# Altium footprint library CryptLib.PcbLib: 44 footprints (part 3 of 3)
Each footprint in its own frame and in the unit in brackets; x right, y up, seen from the top. Pads: shape width x height; smd on the part's side, far side on the other; paste and mask are expansions set on the pad; w line width, h text height; cw(c..) or ccw(c..) is an arc to the next point about the centre after c.
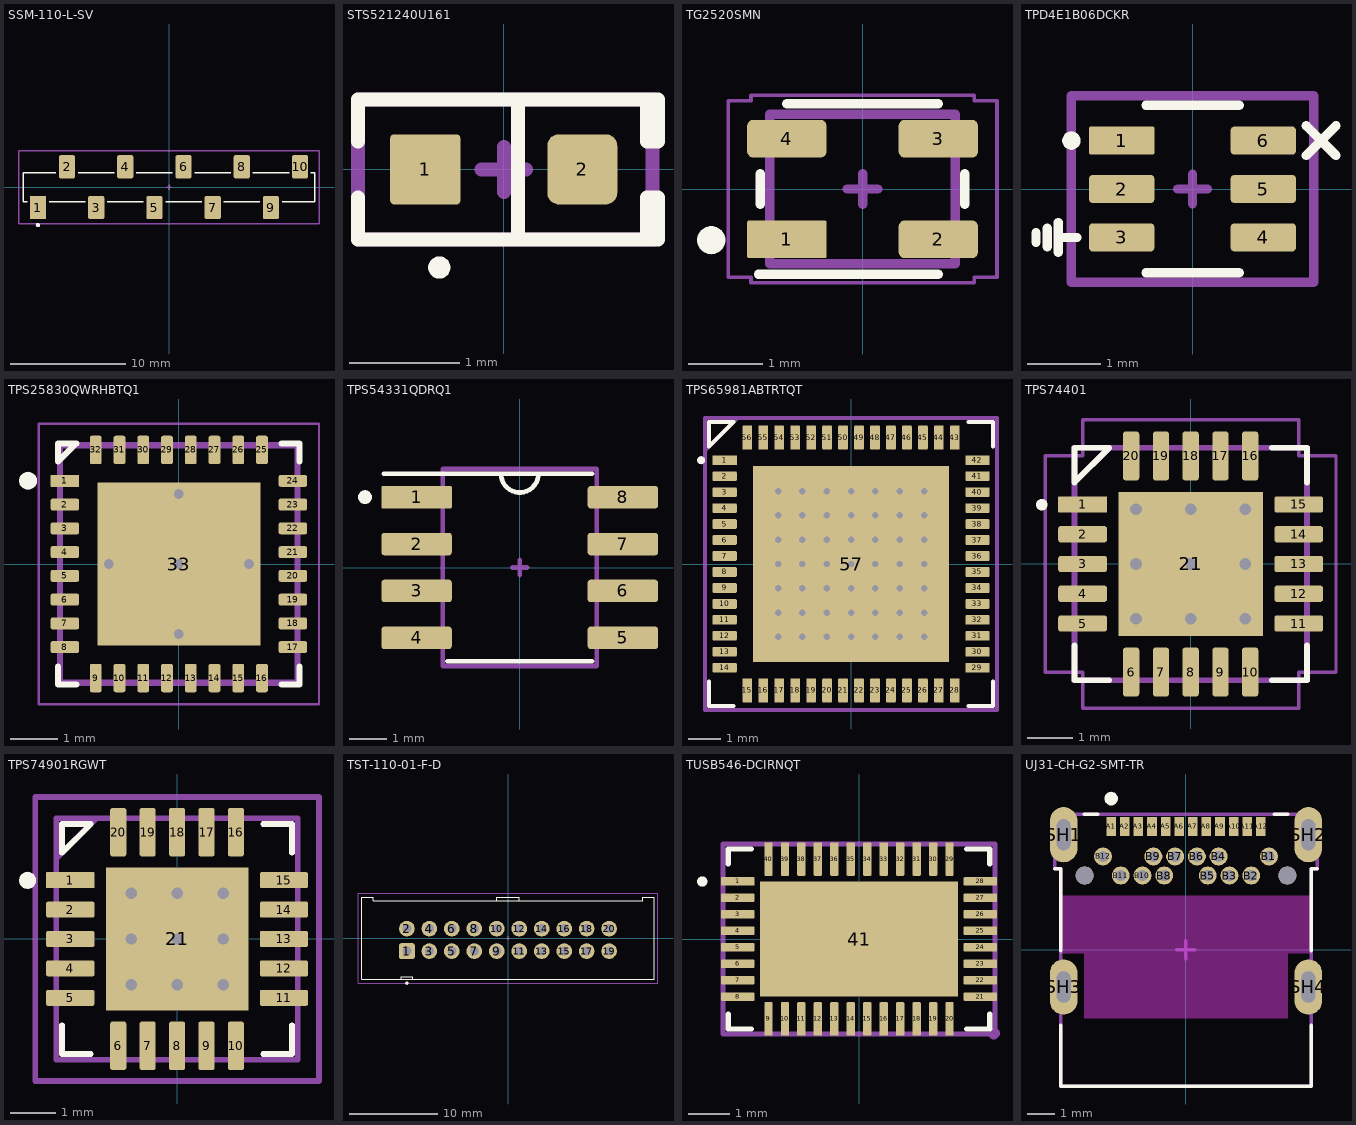
[diagram p2: the footprints below, top view; thin cyan lines are the x and y axes]

## SSM-110-L-SV [mil]
pads (12):
  rrect10% 56x80 smd: 1(-450,-70)
  rrect25% 56x80 smd: 2(-350,70) 3(-250,-70) 4(-150,70) 5(-50,-70) 6(50,70) 7(150,-70) 8(250,70) 9(350,-70) 10(450,70)
  round 15 on Top Overlay: ""(-450,-130)
  round 7.5 on Mech8: ""(-450,-70)
Top Overlay:
  lines w5: -487,-50 -500,-50 -500,50 -388,50 ; -412,-50 -288,-50 ; -312,50 -188,50 ; -212,-50 -88,-50 ; -112,50 12,50 ; -12,-50 112,-50 ; 88,50 212,50 ; 188,-50 312,-50 ; 288,50 412,50 ; 388,-50 500,-50 500,50 487,50
Top Designator:
  text "'.Designator'" at -113.3,-8.33 h20
Top Assembly:
  lines w5: -8,0 8,0 ; 0,-8 0,8 ; -515,-125 -515,125 515,125 515,-125 -515,-125
3D body "SSM-110-L-SV.stp": height 295.5, standoff 0.5, extent -500.01,-90 499.99,90

## STS521240U161 [mil]
pads (4):
  rrect10% 25x25 smd: 1(-28,0)
  rrect33% 25x25 smd: 2(28,0)
  round 7.5 on Mech8: ""(-28,0)
  round 8 on Top Overlay: ""(-23,-35)
Top Overlay:
  lines w5: -52,-10 -52,-25 55,-25 55,-10 51,-10 51,-25 ; -52,10 -52,25 55,25 55,10 51,10 51,25 ; 5,-25 5,25
Top Designator:
  text "'.Designator'" at -113.3,-8.33 h20
Top Assembly:
  lines w5: -8,0 8,0 ; 0,-8 0,8 ; -52,-25 -52,25 53,25 53,-25 -52,-25
3D body "User Library-SOD523-2.step": height 26.13, standoff 0.5, extent -32.48,-15.75 32.48,15.73

## TG2520SMN [mil] "4-SMD 2.5x2.0"
height 32
pads (6):
  rrect10% 42x20 smd: 1(-40,-26.57)
  rrect33% 42x20 smd: 2(40,-26.57) 3(40,26.57) 4(-40,26.57)
  round 15 on Top Overlay: ""(-80,-27)
  round 7.5 on Mech8: ""(-40,-26.57)
Top Overlay:
  lines w5: -55,-45 40,-45 ; -54,-8 -54,8 ; -40,45 40,45 ; 54,-8 54,8
Top Designator:
  text "'.Designator'" at -113.3,-8.33 h20
Top Assembly:
  lines w5: -8,0 8,0 ; 0,-8 0,8 ; -49,-39.5 -49,39.5 49,39.5 49,-39.5 -49,-39.5
Top Courtyard (Mech10):
  lines w2: -71,-46.57 -59,-46.57 -59,-49.5 59,-49.5 59,-46.57 71,-46.57 71,46.57 59,46.57 59,49.5 -59,49.5 -59,46.57 -71,46.57 -71,-46.57
3D body "TG2520SMN.stp": height 32.39, standoff 0.5, extent -51.32,-42.39 51.05,40.29

## TPD4E1B06DCKR [mil]
pads (8):
  rrect10% 35x15 smd: 1(-38,26)
  rrect25% 35x15 smd: 2(-38,0) 3(-38,-26) 4(38,-26) 5(38,0) 6(38,26)
  round 10 on Top Overlay: ""(-65,26)
  round 7.5 on Mech8: ""(-38,26)
Top Overlay:
  lines w5: -84,-28.5 -84,-23.5 ; -78,-31 -78,-21 ; -72,-34 -72,-18 ; -72,-26 -62,-26 ; -25,-45 25,-45 ; -25,45 25,45 ; 61,18 77,34 ; 61,34 77,18
Top Designator:
  text "'.Designator'" at -113.3,-8.33 h20
Top Assembly:
  lines w5: -8,0 8,0 ; 0,-8 0,8
Mechanical 15:
  lines w5: -65,-50 -65,50 65,50 65,-50 -65,-50
3D body "TPD4E1B06DCKR.STEP": height 43.81, standoff 0.5, extent -41.34,-39.38 41.34,39.36

## TPS25830QWRHBTQ1 [mm]
pads (40):
  rrect10% 0.6x0.25 smd mask+0: 1(-2.4,1.75)
  rrect33% 0.6x0.25 smd mask+0: 2(-2.4,1.25) 3(-2.4,0.75) 4(-2.4,0.25) 5(-2.4,-0.25) 6(-2.4,-0.75) 7(-2.4,-1.25) 8(-2.4,-1.75) 17(2.4,-1.75) 18(2.4,-1.25) 19(2.4,-0.75) 20(2.4,-0.25) 21(2.4,0.25) 22(2.4,0.75) 23(2.4,1.25) 24(2.4,1.75)
  rrect33% 0.25x0.6 smd mask+0: 9(-1.75,-2.4) 10(-1.25,-2.4) 11(-0.75,-2.4) 12(-0.25,-2.4) 13(0.25,-2.4) 14(0.75,-2.4) 15(1.25,-2.4) 16(1.75,-2.4) 25(1.75,2.4) 26(1.25,2.4) 27(0.75,2.4) 28(0.25,2.4) 29(-0.25,2.4) 30(-0.75,2.4) 31(-1.25,2.4) 32(-1.75,2.4)
  rect 3.429x3.429 smd paste-253.975 mask+0: 33(0,0)
  round 0.381 on Top Overlay: ""(-3.175,1.753)
  round 0.191 on Mech8: ""(-2.4,1.75)
  round 0.406 hole 0.203 mask+0: ""(-1.475,0) ""(0,-1.475) ""(0,0) ""(0,1.475) ""(1.475,0)
Top Overlay:
  lines w0.127: -2.54,-2.159 -2.54,-2.54 -2.159,-2.54 ; 2.159,-2.54 2.54,-2.54 2.54,-2.159 ; 2.159,2.54 2.54,2.54 2.54,2.159 ; -2.54,2.159 -2.54,2.54 -2.159,2.54 -2.54,2.159
Top Paste:
  region: -0.1,0.1 -1.59,0.1 -1.59,1.59 -0.1,1.59
  region: 1.59,0.1 0.1,0.1 0.1,1.59 1.59,1.59
  region: -0.1,-1.59 -1.59,-1.59 -1.59,-0.1 -0.1,-0.1
  region: 1.59,-1.59 0.1,-1.59 0.1,-0.1 1.59,-0.1
Top Solder:
  drawing of 33 lines, arcs and shapes, not listed
Top Designator:
  text "'.Designator'" at -2.878,-0.212 h0.51
Top Assembly:
  lines w0.127: -2.5,2.199 -2.199,2.5 ; -0.203,0 0.203,0 ; 0,-0.203 0,0.203 ; -2.5,-2.5 2.5,-2.5 2.5,2.5 -2.5,2.5 -2.5,-2.5
Top Courtyard (Mech10):
  lines w0.051: -2.95,-2.95 2.95,-2.95 2.95,2.95 -2.95,2.95 -2.95,-2.95
3D body "TPS25830QWRHBTQ1.STEP": height 1.01, standoff 0.01, extent -2.5,-2.5 2.5,2.5

## TPS54331QDRQ1 [mil]
pads (10):
  rrect10% 75x24 smd: 1(-110,75)
  rrect25% 75x24 smd: 2(-110,25) 3(-110,-25) 4(-110,-75) 5(110,-75) 6(110,-25) 7(110,25) 8(110,75)
  round 15 on Top Overlay: ""(-165,75)
  round 7.5 on Mech8: ""(-110,75)
Top Overlay:
  lines w5: -145,100 77,100 ; -77,-100 77,-100 ; -20,100 ccw(c0,100) 20,100
Top Designator:
  text "'.Designator'" at -113.3,-8.33 h20
Top Assembly:
  lines w5: -8,0 8,0 ; 0,-8 0,8 ; -82,-105 82,-105 82,105 -82,105 -82,-105
3D body "TPS54331QDRQ1.STEP": height 69.4, standoff 0.5, extent -118.11,-96.46 118.11,96.45

## TPS65981ABTRTQT [mil]
pads (108):
  rrect10% 30x12 smd: 1(-155.94,127.95)
  rrect25% 30x12 smd: 2(-155.94,108.27) 3(-155.94,88.58) 4(-155.94,68.9) 5(-155.94,49.21) 6(-155.94,29.53) 7(-155.94,9.84) 8(-155.94,-9.84) 9(-155.94,-29.53) 10(-155.94,-49.21) 11(-155.94,-68.9) 12(-155.94,-88.58) 13(-155.94,-108.27) 14(-155.94,-127.95) 29(155.94,-127.95) 30(155.94,-108.27) 31(155.94,-88.58) 32(155.94,-68.9) 33(155.94,-49.21) 34(155.94,-29.53) 35(155.94,-9.84) 36(155.94,9.84) 37(155.94,29.53) 38(155.94,49.21) 39(155.94,68.9) 40(155.94,88.58) 41(155.94,108.27) 42(155.94,127.95)
  rrect25% 12x30 smd: 15(-127.98,-155.94) 16(-108.3,-155.94) 17(-88.61,-155.94) 18(-68.92,-155.94) 19(-49.23,-155.94) 20(-29.54,-155.94) 21(-9.85,-155.94) 22(9.85,-155.94) 23(29.54,-155.94) 24(49.23,-155.94) 25(68.92,-155.94) 26(88.61,-155.94) 27(108.3,-155.94) 28(127.98,-155.94) 43(127.98,155.94) 44(108.3,155.94) 45(88.61,155.94) 46(68.92,155.94) 47(49.23,155.94) 48(29.54,155.94) 49(9.85,155.94) 50(-9.85,155.94) 51(-29.54,155.94) 52(-49.23,155.94) 53(-68.92,155.94) 54(-88.61,155.94) 55(-108.3,155.94) 56(-127.98,155.94)
  rect 242x242 smd: 57(0,0)
  round 10 on Top Overlay: ""(-185,128)
  round 7.5 on Mech8: ""(-155.94,127.95)
  round 16 hole 8 mask+0: ""(-90,-90) ""(-90,-60) ""(-90,-30) ""(-90,0) ""(-90,30) ""(-90,60) ""(-90,90) ""(-60,-90) ""(-60,-60) ""(-60,-30) ""(-60,0) ""(-60,30) ""(-60,60) ""(-60,90) ""(-30,-90) ""(-30,-60) ""(-30,-30) ""(-30,0) ""(-30,30) ""(-30,60) ""(-30,90) ""(0,-90) ""(0,-60) ""(0,-30) ""(0,0) ""(0,30) ""(0,60) ""(0,90) ""(30,-90) ""(30,-60) ""(30,-30) ""(30,0) ""(30,30) ""(30,60) ""(30,90) ""(60,-90) ""(60,-60) ""(60,-30) ""(60,0) ""(60,30) ""(60,60) ""(60,90) ""(90,-90) ""(90,-60) ""(90,-30) ""(90,0) ""(90,30) ""(90,60) ""(90,90)
Top Overlay:
  lines w5: -175,-145 -175,-175 -145,-175 ; 145,-175 175,-175 175,-145 ; 145,175 175,175 175,145 ; -175,145 -175,175 -145,175 -175,145
Top Designator:
  text "'.Designator'" at -113.3,-8.33 h20
Top Assembly:
  lines w5: -180,140 -140,180 ; -8,0 8,0 ; 0,-8 0,8 ; -180,-180 -180,180 180,180 180,-180 -180,-180
3D body "RTQ0056H.stp": height 39.37, standoff 0, extent -157.48,-157.48 157.49,157.49

## TPS74401 [mil] "LDO Regulator"
height 40
pads (23):
  rrect10% 42x14 smd: 1(-92.91,51.18)
  rrect33% 42x14 smd: 2(-92.91,25.59) 3(-92.91,0) 4(-92.91,-25.59) 5(-92.91,-51.18) 11(92.91,-51.18) 12(92.91,-25.59) 13(92.91,0) 14(92.91,25.59) 15(92.91,51.18)
  rrect33% 14x42 smd: 6(-51.18,-92.91) 7(-25.59,-92.91) 8(0,-92.91) 9(25.59,-92.91) 10(51.18,-92.91) 16(51.18,92.91) 17(25.59,92.91) 18(0,92.91) 19(-25.59,92.91) 20(-51.18,92.91)
  rect 124.02x124.02 smd paste-118.11: 21(0,0)
  round 10 on Top Overlay: ""(-128,51)
  round 7.5 on Mech8: ""(-92.91,51.18)
via 47.05,-47.05 diameter 20 hole 10
via 47.05,47.05 diameter 20 hole 10
via -47.05,47.05 diameter 20 hole 10
via -47.05,-47.05 diameter 20 hole 10
via 0,-47 diameter 20 hole 10
via 0,47 diameter 20 hole 10
via 47,0 diameter 20 hole 10
via -47,0 diameter 20 hole 10
via 0,0 diameter 20 hole 10
Top Overlay:
  lines w5: -100,-70 -100,-100 -70,-100 ; 70,-100 100,-100 100,-70 ; 70,100 100,100 100,70 ; -100,70 -100,100 -70,100 -100,70
Top Paste:
  region: -7.68,-47.05 -47.05,-47.05 -47.05,-7.68 -7.68,-7.68
  region: -7.68,7.68 -47.05,7.68 -47.05,47.05 -7.68,47.05
  region: 47.05,7.68 7.68,7.68 7.68,47.05 47.05,47.05
  region: 47.05,-47.05 7.68,-47.05 7.68,-7.68 47.05,-7.68
Top Designator:
  text "'.Designator'" at -113.3,-8.33 h20
Top Assembly:
  lines w5: -100,70 -70,100 ; -8,0 8,0 ; 0,-8 0,8 ; -100,-100 100,-100 100,100 -100,100 -100,-100
Top Courtyard (Mech10):
  lines w3: 125,91.91 125,-92.91 92.91,-92.91 92.91,-124 -92.91,-124 -92.91,-92.91 -125,-92.91 -125,92.91 -92.91,92.91 -92.91,124 92.91,124 92.91,92.91 125,92.91
3D body "step_temp.STEP": height 39.37, standoff 0, extent -98.43,-98.43 98.43,98.43

## TPS74901RGWT [mil]
pads (23):
  rrect10% 42x14 smd: 1(-92.91,51.18)
  rrect25% 42x14 smd: 2(-92.91,25.59) 3(-92.91,0) 4(-92.91,-25.59) 5(-92.91,-51.18) 11(92.91,-51.18) 12(92.91,-25.59) 13(92.91,0) 14(92.91,25.59) 15(92.91,51.18)
  rrect25% 14x42 smd: 6(-51.18,-92.91) 7(-25.59,-92.91) 8(0,-92.91) 9(25.59,-92.91) 10(51.18,-92.91) 16(51.18,92.91) 17(25.59,92.91) 18(0,92.91) 19(-25.59,92.91) 20(-51.18,92.91)
  rect 124x124 smd paste-999: 21(0,0)
  round 15 on Top Overlay: ""(-130,51)
  round 7.5 on Mech8: ""(-92.91,51.18)
via -40,40 diameter 20 hole 10
via 40,-40 diameter 20 hole 10
via 0,-40 diameter 20 hole 10
via -40,-40 diameter 20 hole 10
via -40,0 diameter 20 hole 10
via 0,40 diameter 20 hole 10
via 40,40 diameter 20 hole 10
via 40,0 diameter 20 hole 10
via 0,0 diameter 20 hole 10
Top Overlay:
  lines w5: -100,-75 -100,-100 -75,-100 ; 75,-100 100,-100 100,-75 ; 75,100 100,100 100,75 ; -100,75 -100,100 -75,100 -100,75
Top Paste:
  region: 47.05,-47.05 7.68,-47.05 7.68,-7.68 47.05,-7.68
  region: 47.05,7.68 7.68,7.68 7.68,47.05 47.05,47.05
  region: -7.68,7.68 -47.05,7.68 -47.05,47.05 -7.68,47.05
  region: -7.68,-47.05 -47.05,-47.05 -47.05,-7.68 -7.68,-7.68
Top Designator:
  text "'.Designator'" at -113.3,-8.33 h20
Top Assembly:
  lines w5: -105,70 -70,105 ; -105,-105 -105,105 105,105 105,-105 -105,-105
Top Courtyard (Mech10):
  lines w5: -123.43,-123.43 -123.43,123.43 123.43,123.43 123.43,-123.43 -123.43,-123.43
3D body "TPS74901RGWT.STEP": height 39.87, standoff 0.5, extent -98.42,-98.42 98.43,98.43

## TST-110-01-F-D [mil]
pads (22):
  rrect25% 70x70 hole 40: 1(-450,-57.48)
  round 70 hole 40: 2(-450,42.52) 3(-350,-57.48) 4(-350,42.52) 5(-250,-57.48) 6(-250,42.52) 7(-150,-57.48) 8(-150,42.52) 9(-50,-57.48) 10(-50,42.52) 11(50,-57.48) 12(50,42.52) 13(150,-57.48) 14(150,42.52) 15(250,-57.48) 16(250,42.52) 17(350,-57.48) 18(350,42.52) 19(450,-57.48) 20(450,42.52)
  round 15 on Top Overlay: ""(-450,-200)
  round 7.5 on Mech8: ""(-450,-57.48)
Top Overlay:
  lines w5: -50,167.48 -50,182.52 50,182.52 50,167.48 ; -475,-182.52 -475,-172.52 ; -475,-182.52 -475,-172.52 ; -475,-182.52 -650,-182.52 -650,182.52 -600,182.52 -600,167.48 -400,167.48 -300,167.48 -200,167.48 -100,167.48 0,167.48 100,167.48 200,167.48 300,167.48 400,167.48 600,167.48 600,182.52 650,182.52 650,-182.52 400,-182.52 300,-182.52 200,-182.52 100,-182.52 0,-182.52 -100,-182.52 -200,-182.52 -300,-182.52 -400,-182.52 -425,-182.52 ; -475,-182.52 -425,-182.52 ; -475,-172.52 -425,-172.52 ; -475,-172.52 -425,-172.52 ; -425,-182.52 -425,-172.52 ; -425,-182.52 -425,-172.52
Top Solder:
  circle w0: c-450,-57.48 r33.9
  circle w0: c-450,42.52 r33.9
  circle w0: c-350,-57.48 r33.9
  circle w0: c-350,42.52 r33.9
  circle w0: c-250,-57.48 r33.9
  circle w0: c-250,42.52 r33.9
  circle w0: c-150,-57.48 r33.9
  circle w0: c-150,42.52 r33.9
  circle w0: c-50,-57.48 r33.9
  circle w0: c-50,42.52 r33.9
  circle w0: c50,-57.48 r33.9
  circle w0: c50,42.52 r33.9
  circle w0: c150,-57.48 r33.9
  circle w0: c150,42.52 r33.9
  circle w0: c250,-57.48 r33.9
  circle w0: c250,42.52 r33.9
  circle w0: c350,-57.48 r33.9
  circle w0: c350,42.52 r33.9
  circle w0: c450,-57.48 r33.9
  circle w0: c450,42.52 r33.9
Bottom Solder:
  circle w0: c-450,-57.48 r33.9
  circle w0: c-450,42.52 r33.9
  circle w0: c-350,-57.48 r33.9
  circle w0: c-350,42.52 r33.9
  circle w0: c-250,-57.48 r33.9
  circle w0: c-250,42.52 r33.9
  circle w0: c-150,-57.48 r33.9
  circle w0: c-150,42.52 r33.9
  circle w0: c-50,-57.48 r33.9
  circle w0: c-50,42.52 r33.9
  circle w0: c50,-57.48 r33.9
  circle w0: c50,42.52 r33.9
  circle w0: c150,-57.48 r33.9
  circle w0: c150,42.52 r33.9
  circle w0: c250,-57.48 r33.9
  circle w0: c250,42.52 r33.9
  circle w0: c350,-57.48 r33.9
  circle w0: c350,42.52 r33.9
  circle w0: c450,-57.48 r33.9
  circle w0: c450,42.52 r33.9
Top Designator:
  text "'.Designator'" at -113.3,-8.33 h20
Top Assembly:
  lines w5: -8,0 8,0 ; 0,-8 0,8 ; -667.72,-200.24 -667.72,200.24 667.72,200.24 667.72,-200.24 -667.72,-200.24
3D body "TST-110-01-F-D.stp": height 350.5, standoff -129.5, extent -650,-182.48 650,182.52

## TUSB546-DCIRNQT [mil]
pads (43):
  rrect10% 32x8 smd: 1(-116,55.12)
  rrect25% 32x8 smd: 2(-116,39.37) 3(-116,23.62) 4(-116,7.87) 5(-116,-7.87) 6(-116,-23.62) 7(-116,-39.37) 8(-116,-55.12) 21(116,-55.12) 22(116,-39.37) 23(116,-23.62) 24(116,-7.87) 25(116,7.87) 26(116,23.62) 27(116,39.37) 28(116,55.12)
  rrect25% 8x32 smd: 9(-86.61,-76.5) 10(-70.87,-76.5) 11(-55.12,-76.5) 12(-39.37,-76.5) 13(-23.62,-76.5) 14(-7.87,-76.5) 15(7.87,-76.5) 16(23.62,-76.5) 17(39.37,-76.5) 18(55.12,-76.5) 19(70.87,-76.5) 20(86.61,-76.5) 29(86.61,76.5) 30(70.87,76.5) 31(55.12,76.5) 32(39.37,76.5) 33(23.62,76.5) 34(7.87,76.5) 35(-7.87,76.5) 36(-23.62,76.5) 37(-39.37,76.5) 38(-55.12,76.5) 39(-70.87,76.5) 40(-86.61,76.5)
  rect 189x110 smd paste-999: 41(0,0)
  round 10 on Top Overlay: ""(-150,55)
  round 7.5 on Mech8: ""(-116,55.12)
Top Overlay:
  lines w5: -125,-72 -125,-86 -103,-86 ; -125,72 -125,86 -103,86 ; 103,-86 125,-86 125,-72 ; 103,86 125,86 125,72
Top Paste:
  region: -35.44,51.06 -90.56,51.06 -90.56,3.94 -35.44,3.94
  region: -35.44,-3.94 -90.56,-3.94 -90.56,-51.06 -35.44,-51.06
  region: 27.56,51.06 -27.56,51.06 -27.56,3.94 27.56,3.94
  region: 27.56,-3.94 -27.56,-3.94 -27.56,-51.06 27.56,-51.06
  region: 90.56,51.06 35.44,51.06 35.44,3.94 90.56,3.94
  region: 90.56,-3.94 35.44,-3.94 35.44,-51.06 90.56,-51.06
Top Designator:
  text "'.Designator'" at -113.3,-8.33 h20
Top Assembly:
  lines w5: -8,0 8,0 ; 0,-8 0,8 ; 129,-91 -130,-91 -130,91 130,91 130,-90
  lines w10: 129,-91 130,-90
3D body "RNQ0040A.stp": height 31.5, standoff 0, extent -118.1,-78.73 118.12,78.75

## UJ31-CH-G2-SMT-TR [mil]
pads (32):
  rect 13.78x27.56 smd: A1(-108,179) A2(-88.31,179) A3(-68.63,179) A4(-48.94,179) A5(-29.26,179) A6(-9.57,179) A7(10.11,179) A8(29.8,179) A9(49.48,179) A10(69.17,179) A11(88.85,179) A12(108.54,179)
  round 26 hole 16: B1(120.35,135.3) B2(94.76,107.74) B3(63.26,107.74) B4(47.51,135.3) B5(31.76,107.74) B6(16.02,135.3) B7(-15.48,135.3) B8(-31.23,107.74) B9(-46.98,135.3) B10(-62.72,107.74) B11(-94.22,107.74) B12(-119.81,135.3)
  oval 40x80 hole 20 slot 45 at 90 deg: SH1(-176.9,166.8) SH2(177.43,166.8) SH3(-176.9,-53.68) SH4(177.43,-53.68)
  round 26 hole 26 unplated: ""(-146.39,107.74) ""(146.92,107.74)
  round 7.5 on Mech8: ""(-108,179)
  round 20 on Top Overlay: ""(-108,219)
Top Overlay:
  lines w5: -189.69,117.58 -180.83,117.58 -180.83,-1 ; -180.83,-108.8 -180.83,-197.38 181.37,-197.38 181.37,-108.8 ; -147.37,196.32 -127.69,196.32 ; 128.22,196.32 147.91,196.32 ; 181.37,-1 181.37,117.58 190.23,117.58
Keep-Out Layer:
  region: 181.37,-4.46 147.91,-4.46 147.91,-98.95 -147.37,-98.95 -147.37,-4.46 -180.83,-4.46 -180.83,78.21 181.37,78.21
  region: 181.37,-4.46 147.91,-4.46 147.91,-98.95 -147.37,-98.95 -147.37,-4.46 -180.83,-4.46 -180.83,78.21 181.37,78.21
Top Designator:
  text "'.Designator'" at -113.3,-8.33 h20
Top Assembly:
  lines w5: -13,0 13,0 ; 0,-13 0,13 ; -189.69,117.58 -180.83,117.58 -180.83,-197.38 181.37,-197.38 181.37,117.58 190.23,117.58 190.23,196.32 -189.69,196.32 -189.69,117.58
3D body "CUI_DEVICES_UJ31-CH-G2-SMT-TR.step": height 176.09, standoff -46.74, extent -190.91,-197.38 191.45,196.32